# Altium footprint library microbuilder.PCBLIB: 422 footprints (part 23 of 27)
Each footprint in its own frame and in the unit in brackets; x right, y up, seen from the top. Pads: shape width x height; smd on the part's side, far side on the other; paste and mask are expansions set on the pad; w line width, h text height; cw(c..) or ccw(c..) is an arc to the next point about the centre after c.
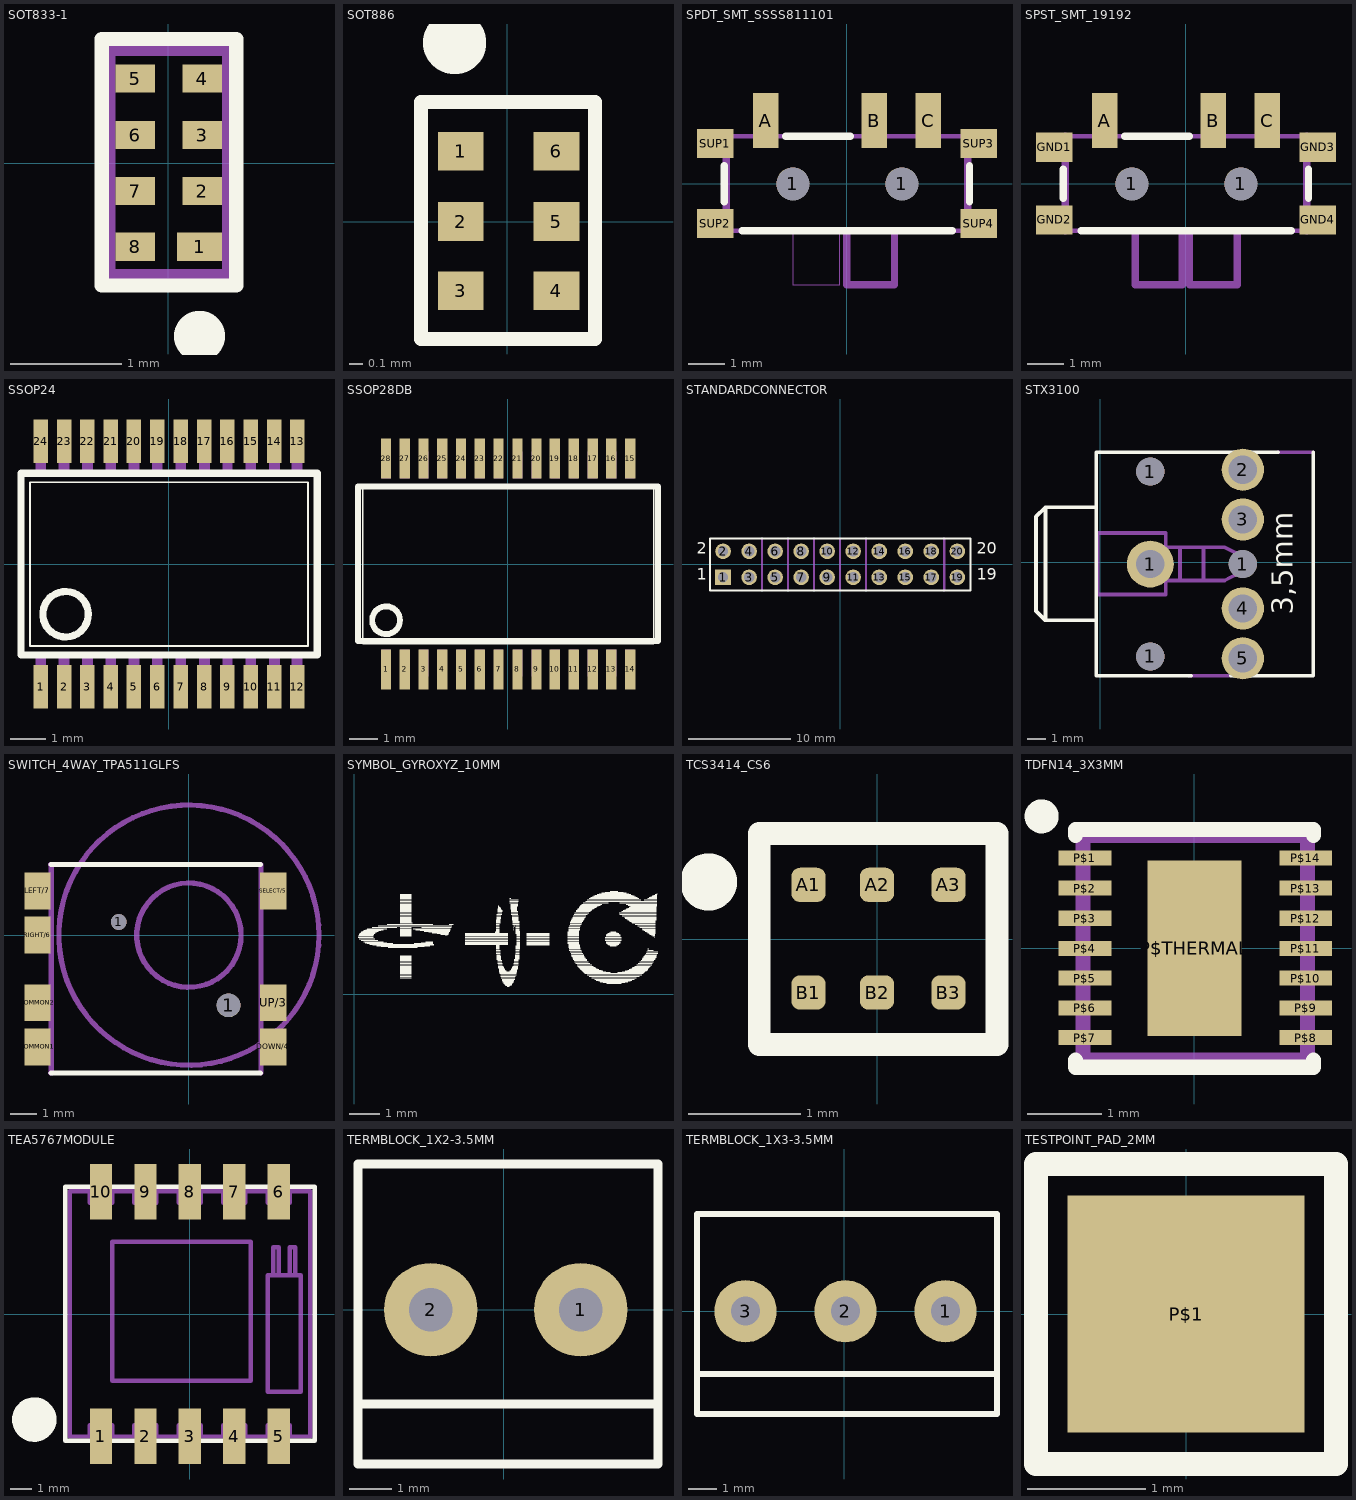
[diagram p22: the footprints below, top view; thin cyan lines are the x and y axes]

## SOT833-1 [mil]
pads (8):
  rect 16x10 smd: 1(11,-29.53)
  rect 14x10 smd: 2(12,-9.84) 3(12,10) 4(12,30) 5(-11.81,30) 6(-11.81,10) 7(-11.81,-9.84) 8(-11.81,-29.53)
Top Overlay:
  circle w16: c11,-61.2 r1
  lines w5: -23.62,-43.31 24,-43.31 24,44 -23.62,44 -23.62,-43.31
Top Paste:
  rectangle: 8,-13.78 18,-5.91
  rectangle: 8,-33.46 18,-25.59
  rectangle: -17.72,-33.46 -7.87,-25.59
  rectangle: -17.72,-13.78 -7.87,-5.91
  rectangle: -17.72,6 -7.87,14
  rectangle: 8,6 18,14
  rectangle: 8,26 18,34
  rectangle: -17.72,26 -7.87,34
Mechanical 16:
  lines w4: -20.67,-39.37 21,-39.37 21,40 -20.67,40 -20.67,-39.37

## SOT886 [mil]
pads (6):
  rect 13x11 smd: 1(-13.29,20) 2(-13.29,0) 3(-13.29,-19.68) 4(14,-19.68) 5(14,0) 6(14,20)
Top Overlay:
  circle w16: c-15,51 r1
  lines w4: -24.61,-33.46 25,-33.46 25,34 -24.61,34 -24.61,-33.46
Top Solder:
  rectangle: 5,13 22,27
  rectangle: 5,-7.28 22,8
  rectangle: 5,-26.97 22,-12.4
  region: -4.82,-12.4 -21.75,-12.4 -21.75,-26.97 -4.82,-26.97
  region: -4.82,8 -21.75,8 -21.75,-7.28 -4.82,-7.28
  region: -4.82,27 -21.75,27 -21.75,13 -4.82,13

## SPDT_SMT_SSSS811101 [mil]
pads (9):
  round 36 hole 36: 1(-59.06,0) 1(60,0)
  rect 28x60 smd: A(-88.58,69) B(30,69) C(89,69)
  rect 40x32 smd: SUP1(-143.7,44) SUP2(-143.7,-43.31) SUP3(144,44) SUP4(144,-43.31)
Top Overlay:
  lines w8: -133.86,-19.68 -133.86,20 ; -114.17,-51.18 115,-51.18 ; -66.93,52 4,52 ; 134,-19.68 134,20
Mechanical 16:
  lines w0: -59.06,-51.18 -59.06,-110.24 -7.87,-110.24 -7.87,-51.18
  lines w5: -131.89,-51.18 132,-51.18 ; -131.89,52 132,52
  lines w8: -131.89,-51.18 -131.89,52 ; 0,-51.18 0,-110.24 52,-110.24 52,-51.18 ; 132,-51.18 132,52

## SPST_SMT_19192 [mil]
pads (9):
  round 36 hole 36: 1(-59.06,0) 1(60,0)
  rect 28x60 smd: A(-88.58,69) B(30,69) C(89,69)
  rect 40x32 smd: GND1(-143.7,40) GND2(-143.7,-39.37) GND3(144,40) GND4(144,-39.37)
Top Overlay:
  lines w8: -133.86,-15.75 -133.86,16 ; -114.17,-51.18 115,-51.18 ; -66.93,52 4,52 ; 134,-15.75 134,16
Mechanical 16:
  lines w5: -131.89,-51.18 4,-51.18 56,-51.18 132,-51.18 ; -131.89,52 132,52
  lines w8: -131.89,-51.18 -131.89,52 ; -55.12,-51.18 -55.12,-110.24 -3.94,-110.24 -3.94,-51.18 ; 4,-51.18 4,-110.24 56,-110.24 56,-51.18 ; 132,-51.18 132,52
  text "0" at -39.37,-98.43 h49.6
  text "1" at 20,-98.43 h49.6

## SSOP24 [mil]
pads (24):
  rect 16x48 smd: 1(-140.75,-134.65) 2(-115.16,-134.65) 3(-89.57,-134.65) 4(-63.98,-134.65) 5(-38.39,-134.65) 6(-12.8,-134.65) 7(13,-134.65) 8(39,-134.65) 9(64,-134.65) 10(90,-134.65) 11(116,-134.65) 12(141,-134.65) 13(141,135) 14(116,135) 15(90,135) 16(64,135) 17(39,135) 18(13,135) 19(-12.8,135) 20(-38.39,135) 21(-63.98,135) 22(-89.57,135) 23(-115.16,135) 24(-140.75,135)
Top Overlay:
  circle w8: c-113.5,-55 r25
  lines w2: -152.52,-90 153,-90 153,90 -152.52,90 -152.52,-90
  lines w8: -162.52,-99.84 163,-99.84 163,100 -162.52,100 -162.52,-99.84
Mechanical 16:
  rectangle: -146.65,-149.61 -134.84,-102.36
  rectangle: -121.06,-149.61 -109.25,-102.36
  rectangle: -95.47,-149.61 -83.66,-102.36
  rectangle: -69.88,-149.61 -58.07,-102.36
  rectangle: -44.29,-149.61 -32.48,-102.36
  rectangle: -18.7,-149.61 -6.89,-102.36
  rectangle: 7,-149.61 19,-102.36
  rectangle: 33,-149.61 45,-102.36
  rectangle: 59,-149.61 70,-102.36
  rectangle: 84,-149.61 96,-102.36
  rectangle: 110,-149.61 122,-102.36
  rectangle: 135,-149.61 147,-102.36
  rectangle: 135,103 147,150
  rectangle: 110,103 122,150
  rectangle: 84,103 96,150
  rectangle: 59,103 70,150
  rectangle: 33,103 45,150
  rectangle: 7,103 19,150
  rectangle: -18.7,103 -6.89,150
  rectangle: -44.29,103 -32.48,150
  rectangle: -69.88,103 -58.07,150
  rectangle: -95.47,103 -83.66,150
  rectangle: -121.06,103 -109.25,150
  rectangle: -146.65,103 -134.84,150

## SSOP28DB [mil]
pads (28):
  rect 14x55 smd: 1(-166.34,-143.94) 2(-140.75,-143.94) 3(-115.16,-143.94) 4(-89.57,-143.94) 5(-63.98,-143.94) 6(-38.39,-143.94) 7(-12.8,-143.94) 8(13,-143.94) 9(39,-143.94) 10(64,-143.94) 11(90,-143.94) 12(116,-143.94) 13(141,-143.94) 14(167,-143.94) 15(167,144) 16(141,144) 17(116,144) 18(90,144) 19(64,144) 20(39,144) 21(13,144) 22(-12.8,144) 23(-38.39,144) 24(-63.98,144) 25(-89.57,144) 26(-115.16,144) 27(-140.75,144) 28(-166.34,144)
Top Overlay:
  circle w8: c-166.34,-76.77 r19
  lines w2: -198.35,-108.78 199,-108.78 199,109 -198.35,109 -198.35,-108.78
  lines w8: -204.72,-105.31 205,-105.31 205,106 -204.72,106 -204.72,-105.31
Mechanical 16:
  rectangle: -172.74,117 -159.94,154
  rectangle: -172.74,-153.54 -159.94,-116.76
  rectangle: -147.15,-153.54 -134.35,-116.76
  rectangle: -121.56,-153.54 -108.76,-116.76
  rectangle: -147.15,117 -134.35,154
  rectangle: -121.56,117 -108.76,154
  rectangle: -95.96,117 -83.17,154
  rectangle: -70.37,117 -57.58,154
  rectangle: -44.78,117 -31.99,154
  rectangle: -19.19,117 -6.4,154
  rectangle: 7,117 20,154
  rectangle: 32,117 45,154
  rectangle: 58,117 71,154
  rectangle: 84,117 96,154
  rectangle: 109,117 122,154
  rectangle: 135,117 148,154
  rectangle: 160,117 173,154
  rectangle: -95.96,-153.54 -83.17,-116.76
  rectangle: -70.37,-153.54 -57.58,-116.76
  rectangle: -44.78,-153.54 -31.99,-116.76
  rectangle: -19.19,-153.54 -6.4,-116.76
  rectangle: 7,-153.54 20,-116.76
  rectangle: 32,-153.54 45,-116.76
  rectangle: 58,-153.54 71,-116.76
  rectangle: 84,-153.54 96,-116.76
  rectangle: 109,-153.54 122,-116.76
  rectangle: 135,-153.54 148,-116.76
  rectangle: 160,-153.54 173,-116.76

## STANDARDCONNECTOR [mil]
pads (20):
  rect 60x60 hole 40: 1(-450,-50)
  round 60 hole 40: 2(-450,50) 3(-350,-50) 4(-350,50) 5(-250,-50) 6(-250,50) 7(-150,-50) 8(-150,50) 9(-50,-50) 10(-50,50) 11(50,-50) 12(50,50) 13(150,-50) 14(150,50) 15(250,-50) 16(250,50) 17(350,-50) 18(350,50) 19(450,-50) 20(450,50)
Top Overlay:
  lines w8: -500,-100 -500,100 500,100 500,-100 -500,-100
  text "1" at -550,-75 h77.5
  text "2" at -550,25 h77.5
  text "19" at 525,-75 h77.5
  text "20" at 525,25 h77.5
Mechanical 16:
  rectangle: -460,-60 -440,-40
  rectangle: -460,40 -440,60
  rectangle: -360,40 -340,60
  rectangle: -360,-60 -340,-40
  rectangle: -260,40 -240,60
  rectangle: -260,-60 -240,-40
  rectangle: -160,40 -140,60
  rectangle: -60,40 -40,60
  rectangle: 40,40 60,60
  rectangle: -160,-60 -140,-40
  rectangle: -60,-60 -40,-40
  rectangle: 40,-60 60,-40
  rectangle: 140,40 160,60
  rectangle: 140,-60 160,-40
  rectangle: 240,40 260,60
  rectangle: 240,-60 260,-40
  rectangle: 340,40 360,60
  rectangle: 340,-60 360,-40
  rectangle: 440,40 460,60
  rectangle: 440,-60 460,-40
  lines w8: -300,-100 -300,100 ; -200,-100 -200,100 ; -100,-100 -100,100 ; 0,-100 0,100 ; 100,-100 100,100 ; 400,-100 400,100
  text "CS" at -472.44,-137.8 h37.2
  text "CLK" at -472.44,119 h37.2
  text "MOSI" at -393.7,-137.8 h37.2
  text "MISO" at -393.7,119 h37.2
  text "SCL" at -275.59,-137.8 h37.2
  text "SDA" at -275.59,119 h37.2
  text "INT" at -177.17,-137.8 h37.2
  text "INT" at -177.17,119 h37.2
  text "GND" at -78.74,-137.8 h37.2
  text "GND" at -78.74,119 h37.2
  text "ADC" at 20,-137.8 h37.2
  text "ADC" at 20,119 h37.2
  text "GPIO" at 119,-137.8 h37.2
  text "GPIO" at 119,119 h37.2
  text "GPIO" at 217,-137.8 h37.2
  text "GPIO" at 217,119 h37.2
  text "GPIO" at 315,-137.8 h37.2
  text "GPIO" at 315,119 h37.2
  text "3.3V" at 414,-137.8 h37.2
  text "5.0V" at 414,119 h37.2

## STX3100 [mil]
pads (8):
  round 60 hole 60: 1(107,-200.79) 1(107,193) 1(304,-3.94)
  round 100 hole 60: 1(107,-3.94)
  round 90 hole 60: 2(304,197) 3(304,91) 4(304,-98.43) 5(304,-204.72)
Top Overlay:
  lines w8: 194,-241.81 -8.35,-241.81 -8.35,-123.94 ; 279,-241.81 454,-241.81 454,234 ; 379,234 -8.35,234 -8.35,117 ; -116.54,-123.94 -8.35,-123.94 ; -116.54,-123.94 -136.54,-103.94 -136.54,97 -116.54,117 ; -116.54,-123.94 -116.54,117 ; -116.54,117 -8.35,117 ; -8.35,-123.94 -8.35,117 ; 454,234 454,234
  text "3,5mm" at 425,-111.46 h77.5
Mechanical 16:
  lines w8: 190,-241.81 275,-241.81 ; 379,234 454,234 ; 140,-38.94 140,32 ; 140,-38.94 140,-68.94 -5.16,-68.94 -5.16,62 140,62 140,32 ; 140,-38.94 170,-38.94 ; 140,32 170,32 ; 170,-38.94 220,-38.94 ; 170,-38.94 170,32 ; 170,32 220,32 ; 220,-38.94 220,32 ; 220,-38.94 265,-38.94 295,-23.94 295,17 265,32 220,32

## SWITCH_4WAY_TPA511GLFS [mil]
pads (9):
  round 24 hole 24: 1(-106.3,20)
  round 36 hole 36: 1(60,-106.3)
  rect 40x56 smd: COMMON1(-229.33,-169.29) COMMON2(-229.33,-102.36) DOWN/4(128,-169.29) LEFT/7(-229.33,67) RIGHT/6(-229.33,0) SELECT/5(128,67) UP/3(128,-102.36)
Top Overlay:
  lines w8: -208.66,-208.66 108,-208.66 ; -208.66,107 108,107
Mechanical 16:
  circle w8: c0,0 r79
  circle w8: c0,0 r197
  rectangle: -237.2,48 -209.65,87
  rectangle: -237.2,-19.68 -209.65,20
  rectangle: 109,48 136,87
  rectangle: -237.2,-122.05 -209.65,-82.68
  rectangle: -237.2,-188.98 -209.65,-149.61
  rectangle: 109,-188.98 136,-149.61
  rectangle: 109,-122.05 136,-82.68
  lines w5: -208.66,-208.66 108,-208.66 ; -208.66,107 108,107
  lines w8: -209.65,-208.66 -208.66,-208.66 -208.66,107 -209.65,107 ; 109,-208.66 109,107

## SYMBOL_GYROXYZ_10MM [mil]
Top Overlay:
  drawing of 1168 lines, arcs and shapes, not listed

## TCS3414_CS6 [mil]
pads (6):
  rrect50% 12x12 smd: A1(-24.02,19) A2(0,19) A3(25,19) B1(-24.02,-18.7) B2(0,-18.7) B3(25,-18.7)
Top Overlay:
  circle w12: c-59.06,20 r4
  lines w8: -41.24,-36.91 -41.24,37 42,37 42,-36.91 -41.24,-36.91
Mechanical 16:
  lines w5: -41.24,-36.91 42,-36.91 42,37 -41.24,37 -41.24,-36.91
  text "A1" at -50,10 h18.6
  text "A3" at 60,10 h18.6
  text "B1" at -50,-30 h18.6
  text "B3" at 60,-30 h18.6

## TDFN14_3X3MM [mil]
pads (15):
  rect 28x8 smd: P$1(-58.07,48) P$2(-58.07,32) P$3(-58.07,16) P$4(-58.07,0) P$5(-58.07,-15.75) P$6(-58.07,-31.5) P$7(-58.07,-47.24) P$8(59,-47.24) P$9(59,-31.5) P$10(59,-15.75) P$11(59,0) P$12(59,16) P$13(59,32) P$14(59,48)
  rect 50x93 smd: P$THERMAL(0,0)
Top Overlay:
  circle w12: c-81,70 r3
  lines w8: -62.99,-59.06 -62.99,-62.99 63,-62.99 63,-59.06 ; -62.99,60 -62.99,63 63,63 63,60
Top Paste:
  rectangle: -19.68,8 -3.94,40
  rectangle: 4,8 20,40
  rectangle: -19.68,-39.37 -3.94,-7.87
  rectangle: 4,-39.37 20,-7.87
  rectangle: -68.9,44 -47.24,51
  rectangle: -68.9,29 -47.24,35
  rectangle: -68.9,13 -47.24,20
  rectangle: -68.9,-3.44 -47.24,4
  rectangle: -68.9,-19.19 -47.24,-12.3
  rectangle: -68.9,-34.94 -47.24,-28.05
  rectangle: -68.9,-50.69 -47.24,-43.8
  rectangle: 48,-50.69 69,-43.8
  rectangle: 48,-34.94 69,-28.05
  rectangle: 48,-19.19 69,-12.3
  rectangle: 48,-3.44 69,4
  rectangle: 48,13 69,20
  rectangle: 48,29 69,35
  rectangle: 48,44 69,51
Top Solder:
  rectangle: -74.8,-54.13 -41.34,55
  rectangle: 42,-54.13 75,55
Mechanical 16:
  lines w8: -59.06,-59.06 60,-59.06 60,60 -59.06,60 -59.06,-59.06

## TEA5767MODULE [mil]
pads (10):
  rect 40x100 smd: 1(-160,-220) 2(-80,-220) 3(0,-220) 4(80,-220) 5(160,-220) 6(160,220) 7(80,220) 8(0,220) 9(-80,220) 10(-160,220)
Top Overlay:
  circle w40: c-280,-190 r20
  lines w8: -224.41,-228.35 225,-228.35 225,229 -224.41,229 -224.41,-228.35
Mechanical 16:
  lines w8: -180,-220 -180,-200 -140,-200 -140,-220 ; -180,220 -180,200 -140,200 -140,220 ; -100,-220 -100,-200 -60,-200 -60,-220 ; -100,220 -100,200 -60,200 -60,220 ; -20,-220 -20,-200 20,-200 20,-220 ; -20,220 -20,200 20,200 20,220 ; 60,-220 60,-200 100,-200 100,-220 ; 60,220 60,200 100,200 100,220 ; 140,-220 140,-200 180,-200 180,-220 ; 140,220 140,200 180,200 180,220 ; 150,70 140,70 140,-140 200,-140 200,70 190,70 ; 150,70 160,70 ; 150,70 150,120 160,120 160,70 ; 160,70 180,70 ; 180,70 190,70 ; 180,70 180,120 190,120 190,70 ; -216.54,-220.47 217,-220.47 217,221 -216.54,221 -216.54,-220.47 ; -140,-120 110,-120 110,130 -140,130 -140,-120

## TERMBLOCK_1X2-3.5MM [mil]
pads (2):
  round 86 hole 40: 1(71,0) 2(-66.93,0)
Top Overlay:
  lines w8: -133.86,-86.61 -133.86,134 142,134 142,-86.61 ; -133.86,-86.61 -133.86,-141.73 142,-141.73 142,-86.61 ; -133.86,-86.61 142,-86.61

## TERMBLOCK_1X3-3.5MM [mil]
pads (3):
  round 86 hole 40: 1(140,0) 2(2,0) 3(-135.83,0)
Top Overlay:
  lines w8: -202.76,-86.61 -202.76,134 211,134 211,-86.61 ; -202.76,-86.61 -202.76,-141.73 211,-141.73 211,-86.61 ; -202.76,-86.61 211,-86.61

## TESTPOINT_PAD_2MM [mil]
pads (1):
  rect 79x79 smd: P$1(0,0)
Top Overlay:
  lines w8: -50,-50 50,-50 50,50 -50,50 -50,-50